# Altium footprint library DipComponent.PcbLib: 303 footprints (part 4 of 19)
Each footprint in its own frame and in the unit in brackets; x right, y up, seen from the top. Pads: shape width x height; smd on the part's side, far side on the other; paste and mask are expansions set on the pad; w line width, h text height; cw(c..) or ccw(c..) is an arc to the next point about the centre after c.
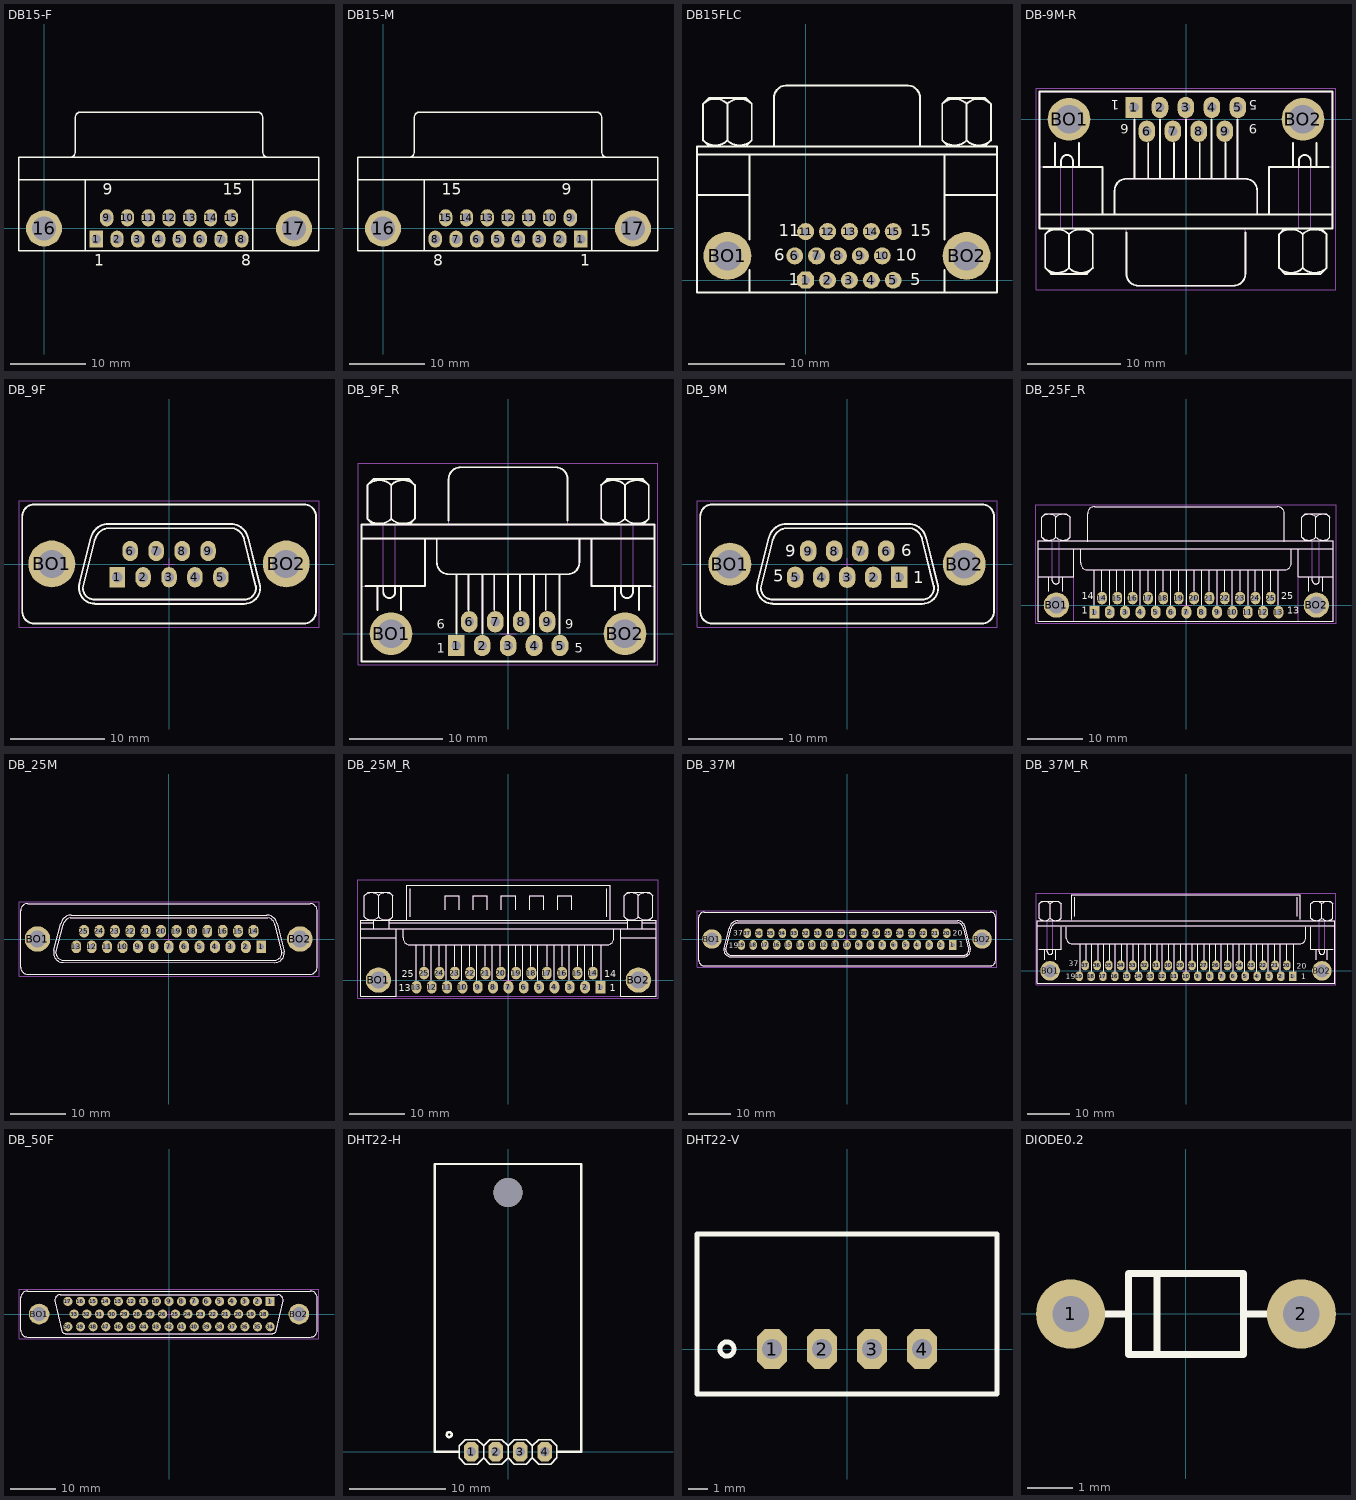
[diagram p3: the footprints below, top view; thin cyan lines are the x and y axes]

## DB15-F [mil]
pads (17):
  rect 70x90 hole 50: 1(273.98,-56.14)
  oval 70x90 hole 50: 2(383.03,-56.14) 3(492.09,-56.14) 4(601.14,-56.14) 5(710.2,-56.14) 6(819.25,-56.14) 7(928.31,-56.14) 8(1037.36,-56.14) 9(328.5,55.67) 10(437.56,55.67) 11(546.61,55.67) 12(655.67,55.67) 13(764.72,55.67) 14(873.78,55.67) 15(982.83,55.67)
  round 188.98 hole 125.2: 16(-0.24,-0.24) 17(1311.57,-0.24)
Top Overlay:
  lines w7.87: -131.73,255.67 1443.07,255.67 ; 136.18,373.98 ccw(c136.18,401.34) 163.54,401.34 163.54,582.44 ; 163.74,582.64 cw(c191.1,582.64) 191.1,610 1120.24,610 cw(c1120.24,582.64) 1147.6,582.64 ; 217.09,-118.35 217.09,255.67 ; 1094.25,-118.35 1094.25,255.67 ; 1147.79,582.44 1147.79,401.34 ccw(c1175.16,401.34) 1175.16,373.98 ; -131.73,-118.35 -131.73,373.78 1443.07,373.78 1443.07,-118.35 -131.73,-118.35
  text "1" at 264.13,-196.1 h59.06
  text "8" at 1035.67,-196.1 h59.06
  text "15" at 938.54,177.91 h59.06
  text "9" at 308.82,177.91 h59.06
3D body "CircuitWorks-DB15RA_M.STEP": height 494.69, standoff -137.2, extent -125.54,-125.16 1434.31,615

## DB15-M [mil]
pads (17):
  rect 70x90 hole 50: 1(1037.36,-56.14)
  oval 70x90 hole 50: 2(928.31,-56.14) 3(819.25,-56.14) 4(710.2,-56.14) 5(601.14,-56.14) 6(492.09,-56.14) 7(383.03,-56.14) 8(273.98,-56.14) 9(982.83,55.67) 10(873.78,55.67) 11(764.72,55.67) 12(655.67,55.67) 13(546.61,55.67) 14(437.56,55.67) 15(328.5,55.67)
  round 188.98 hole 125.2: 16(-0.24,-0.24) 17(1311.57,-0.24)
Top Overlay:
  lines w7.87: -131.73,255.67 1443.07,255.67 ; 136.18,373.98 ccw(c136.18,401.34) 163.54,401.34 163.54,582.44 ; 163.74,582.64 cw(c191.1,582.64) 191.1,610 1120.24,610 cw(c1120.24,582.64) 1147.6,582.64 ; 217.09,-118.35 217.09,255.67 ; 1094.25,-118.35 1094.25,255.67 ; 1147.79,582.44 1147.79,401.34 ccw(c1175.16,401.34) 1175.16,373.98 ; -131.73,-118.35 1443.07,-118.35 1443.07,373.78 -131.73,373.78 -131.73,-118.35
  text "15" at 308.82,177.91 h59.06
  text "9" at 938.54,177.91 h59.06
  text "1" at 1035.67,-196.1 h59.06
  text "8" at 264.13,-196.1 h59.06
3D body "CircuitWorks-DB15RA_M.STEP": height 494.69, standoff -137.2, extent -121.67,-125.35 1438.18,614.81

## DB15FLC [mil]
pads (17):
  oct 70x70 hole 35.43: 1(0,0)
  round 70 hole 35.43: 2(90,0) 3(180,0) 4(270,0) 5(360,0) 6(-45,100) 7(45,100) 8(135,100) 9(225,100) 10(315,100) 11(0,200) 12(90,200) 13(180,200) 14(270,200) 15(360,200)
  round 196.67 hole 118.33: BO1(-321.67,100) BO2(661.67,100)
Top Overlay:
  lines w8: -446.67,350 -230,350 ; -446.67,516.67 786.67,516.67 ; -421.75,574.91 ccw(c-371.67,625) -321.58,574.91 ; -421.75,725.09 cw(c-371.67,675) -321.58,725.09 ; -396.67,550 -421.67,575 -421.67,725 -396.67,750 -246.67,750 -221.67,725 -221.67,575 -246.67,550 ; -321.75,574.91 ccw(c-271.67,625) -221.58,574.91 ; -321.75,725.09 cw(c-271.67,675) -221.58,725.09 ; -321.67,575 -321.67,725 ; -230,-50 -230,41.67 ; -230,166.67 -230,350 ; -230,516.67 -230,350 ; -130,550 -130,750 cw(c-80,750) -80,800 420,800 cw(c420,750) 470,750 470,550 ; 561.58,574.91 ccw(c611.67,625) 661.75,574.91 ; 561.58,725.09 cw(c611.67,675) 661.75,725.09 ; 570,-50 570,41.67 ; 570,166.67 570,350 ; 570,516.67 570,350 ; 586.67,550 561.67,575 561.67,725 586.67,750 736.67,750 761.67,725 761.67,575 736.67,550 ; 661.58,574.91 ccw(c711.67,625) 761.75,574.91 ; 661.58,725.09 cw(c711.67,675) 761.75,725.09 ; 661.67,575 661.67,725 ; 786.67,350 570,350 ; -446.67,-50 786.67,-50 786.67,550 -446.67,550 -446.67,-50
  text "1" at -70,-20 h50
  text "6" at -130,80 h50
  text "11" at -110,180 h50
  text "15" at 430,180 h50
  text "10" at 370,80 h50
  text "5" at 430,-20 h50

## DB-9M-R [mil]
pads (11):
  rect 70x90 hole 40: 1(-218.75,50)
  oval 70x90 hole 40: 2(-109.58,50) 3(-0.42,50) 4(108.75,50) 5(217.92,50) 6(-164.58,-50) 7(-55.42,-50) 8(53.75,-50) 9(162.92,-50)
  round 180 hole 120: BO1(-492.08,0) BO2(492.08,0)
Top Overlay:
  lines w8: -617.08,-400 616.25,-400 ; -600.42,-200 -350.42,-200 -350.42,-400 ; -592.17,-625.09 ccw(c-542.08,-575) -492,-625.09 ; -592.17,-483.25 cw(c-542.08,-533.33) -492,-483.25 ; -567.08,-458.33 -592.08,-483.33 -592.08,-625 -567.08,-650 -417.08,-650 -392.08,-625 -392.08,-483.33 -417.08,-458.33 ; -550.42,-200 -550.42,-100 ; -525.42,-200 -525.42,-175 cw(c-500.42,-175) -475.42,-175 -475.42,-200 ; -492.17,-625.09 ccw(c-442.08,-575) -392,-625.09 ; -492.17,-483.25 cw(c-442.08,-533.33) -392,-483.25 ; -492.08,-625 -492.08,-483.33 ; -450.42,-200 -450.42,-100 ; -300.42,-400 -300.42,-300 cw(c-250.42,-300) -250.42,-250 249.58,-250 cw(c249.58,-300) 299.58,-300 299.58,-400 ; -250.42,-475 -250.42,-650 ccw(c-200.42,-650) -200.42,-700 199.58,-700 ccw(c199.58,-650) 249.58,-650 249.58,-475 ; -217.08,-250 -217.08,0 ; -158.75,-250 -158.75,-100 ; -108.75,-250 -108.75,0 ; -50.42,-250 -50.42,-100 ; -0.42,-250 -0.42,0 ; 57.92,-250 57.92,-100 ; 107.92,-250 107.92,0 ; 166.25,-250 166.25,-100 ; 216.25,-250 216.25,0 ; 349.58,-400 349.58,-200 599.58,-200 ; 391.16,-625.09 ccw(c441.25,-575) 491.34,-625.09 ; 391.16,-483.25 cw(c441.25,-533.33) 491.34,-483.25 ; 416.25,-458.33 391.25,-483.33 391.25,-625 416.25,-650 566.25,-650 591.25,-625 591.25,-483.33 566.25,-458.33 ; 449.58,-200 449.58,-100 ; 474.58,-200 474.58,-175 cw(c499.58,-175) 524.58,-175 524.58,-200 ; 491.16,-625.09 ccw(c541.25,-575) 591.34,-625.09 ; 491.16,-483.25 cw(c541.25,-533.33) 591.34,-483.25 ; 491.25,-625 491.25,-483.33 ; 549.58,-200 549.58,-100 ; -617.08,-458.33 616.25,-458.33 616.25,116.67 -617.08,116.67 -617.08,-458.33
  text "9" at 299.58,-20 h40
  text "5" at 299.58,80 h40
  text "1" at -280.42,80 h40
  text "6" at -240.42,-20 h40
Mechanical 13:
  lines w3.94: -617.08,-400 616.25,-400 ; -617.08,-200 -350.42,-200 -350.42,-400 ; -592.17,-625.09 ccw(c-542.08,-575) -492,-625.09 ; -592.17,-483.25 cw(c-542.08,-533.33) -492,-483.25 ; -567.08,-458.33 -592.08,-483.33 -592.08,-625 -567.08,-650 -417.08,-650 -392.08,-625 -392.08,-483.33 -417.08,-458.33 ; -550.42,-200 -550.42,-100 ; -526,-200 -526,-458.33 -476,-458.33 -476,-200 -475,-200 ; -525.42,-200 -525.42,-175 cw(c-500.42,-175) -475.42,-175 -475.42,-200 ; -492.17,-625.09 ccw(c-442.08,-575) -392,-625.09 ; -492.17,-483.25 cw(c-442.08,-533.33) -392,-483.25 ; -492.08,-625 -492.08,-483.33 ; -450.42,-200 -450.42,-100 ; -300.42,-400 -300.42,-300 cw(c-250.42,-300) -250.42,-250 249.58,-250 cw(c249.58,-300) 299.58,-300 299.58,-400 ; -250.42,-458.33 -250.42,-650 ccw(c-200.42,-650) -200.42,-700 199.58,-700 ccw(c199.58,-650) 249.58,-650 249.58,-458.33 ; -217.08,-250 -217.08,0 ; -158.75,-250 -158.75,-100 ; -108.75,-250 -108.75,0 ; -50.42,-250 -50.42,-100 ; -0.42,-250 -0.42,0 ; 57.92,-250 57.92,-100 ; 107.92,-250 107.92,0 ; 166.25,-250 166.25,-100 ; 216.25,-250 216.25,0 ; 349.58,-400 349.58,-200 616.25,-200 ; 391.16,-625.09 ccw(c441.25,-575) 491.34,-625.09 ; 391.16,-483.25 cw(c441.25,-533.33) 491.34,-483.25 ; 416.25,-458.33 391.25,-483.33 391.25,-625 416.25,-650 566.25,-650 591.25,-625 591.25,-483.33 566.25,-458.33 ; 449.58,-200 449.58,-100 ; 474.42,-458.33 474.42,-200 ; 474.58,-200 474.58,-175 cw(c499.58,-175) 524.58,-175 524.58,-200 ; 491.16,-625.09 ccw(c541.25,-575) 591.34,-625.09 ; 491.16,-483.25 cw(c541.25,-533.33) 591.34,-483.25 ; 491.25,-625 491.25,-483.33 ; 524.42,-458.33 524.42,-200 ; 549.58,-200 549.58,-100 ; -617.08,-458.33 -617.08,116.67 616.25,116.67 616.25,-458.33 -617.08,-458.33
Mechanical 15:
  lines w3.94: -35,0 0,0 ; 0,-35 0,0 ; 0,35 0,0 ; 35,0 0,0 ; -631,-716 -631,130 631,130 631,-716 -631,-716
3D body: height 236.22, standoff 0, extent -250.42,-700 249.58,-458.33
3D body: height 236.22, standoff 0, extent -300.65,-399.98 299.6,-249.55
3D body: height 39.37, standoff 0, extent -617.06,-399.98 -350.44,116.67
3D body: height 236.22, standoff 0, extent -617.06,-458.31 616.23,-400.02
3D body: height 39.37, standoff 0, extent 349.6,-399.98 616.23,116.67
3D body: height 157.48, standoff 78.74, extent 391.25,-650 591.34,-458.33
3D body: height 196.85, standoff 78.74, extent -592.08,-650 -392,-458.33
3D body: height 236.22, standoff 0, extent -350.44,-400 350,116.67
3D body: height 157.48, standoff 78.74, extent -526,-458.33 -475.42,-150
3D body: height 157.48, standoff 78.74, extent 474.42,-458.33 525,-150

## DB_9F [mil] "D Type Connector, 9 Pin,FeMale, ST"
height 433.07
pads (11):
  rect 65x85 hole 43.31: 1(-217.92,-55)
  oval 65x85 hole 43.31: 2(-108.92,-55) 3(0.08,-55) 4(109.08,-55) 5(218.08,-55) 6(-162.92,55) 7(-53.92,55) 8(55.08,55) 9(164.08,55)
  round 196.67 hole 118.33: BO1(-492.08,0.83) BO2(492.08,0.83)
Top Overlay:
  lines w8: -616.25,200.83 cw(c-566.25,200.83) -566.25,250.83 567.08,250.83 cw(c567.08,200.83) 617.08,200.83 617.08,-199.17 cw(c567.08,-199.17) 567.08,-249.17 -566.25,-249.17 cw(c-566.25,-199.17) -616.25,-199.17 -616.25,209.17 ; -377.08,-80.83 -328.75,109.17 ; -376.17,-80.79 ccw(c-312.08,-99.17) -312.08,-165.83 ; -328.45,109.75 cw(c-253.75,92.5) -253.75,169.16 257.58,169.16 cw(c257.58,92.5) 332.28,109.75 ; -312.08,100.83 -362.08,-99.17 ccw(c-312.08,-99.17) -312.08,-149.17 315.92,-149.17 ccw(c315.92,-99.17) 365.3,-91.35 ; -311.72,100.7 cw(c-245.42,84.17) -261.95,150.47 267.58,150.81 cw(c257.58,92.5) 316.17,100.73 ; -311.25,-166.67 315.92,-166.67 ccw(c315.92,-99.17) 382.91,-90.94 ; 315.92,100.83 365.92,-99.17 ; 332.58,109.17 382.58,-90.83
Mechanical 13:
  lines w3.94: -616.25,200.83 cw(c-566.25,200.83) -566.25,250.83 567.08,250.83 cw(c567.08,200.83) 617.08,200.83 617.08,-199.17 cw(c567.08,-199.17) 567.08,-249.17 -566.25,-249.17 cw(c-566.25,-199.17) -616.25,-199.17 -616.25,209.17 ; -377.14,-81.07 -328.75,109.17 ; -376.61,-79.09 ccw(c-311.25,-97.83) -311.25,-165.83 315.92,-166.67 ccw(c315.92,-99.17) 382.91,-90.94 332.28,109.75 ccw(c257.58,92.5) 257.58,169.16 -253.75,169.16 ccw(c-253.75,92.5) -328.45,109.75 ; -312.08,100.83 -362.08,-99.17 ccw(c-312.08,-99.17) -312.08,-149.17 317.05,-149.17 ccw(c317.05,-100.3) 365.92,-100.3 365.92,-99.17 316.15,100.87 ccw(c257.58,92.5) 267.58,150.81 -261.95,150.47 ccw(c-245.42,84.17) -311.72,100.7
Mechanical 15:
  lines w3.94: -25,0 0,0 ; 0,-25 0,0 ; 0,25 0,0 ; 25,0 0,0 ; -630,-265 -630,266 630,266 630,-265 -630,-265
3D body: height 433.07, standoff 0, extent -379.51,-166.67 382.91,169.16
3D body: height 208, standoff 200, extent -616.23,-249.15 617.06,250.81

## DB_9F_R [mil] "D Type Connector, 9 Pin,FeMale, RA"
height 492.13
pads (11):
  rect 70x90 hole 40: 1(-217.92,-50)
  oval 70x90 hole 40: 2(-108.75,-50) 3(0.42,-50) 4(109.58,-50) 5(218.75,-50) 6(-162.92,50) 7(-53.75,50) 8(55.42,50) 9(164.58,50)
  round 180 hole 120: BO1(-492.08,0) BO2(492.08,0)
Top Overlay:
  lines w8: -616.25,400 617.08,400 ; -599.58,200 -349.58,200 -349.58,400 ; -591.34,483.25 ccw(c-541.25,533.33) -491.16,483.25 ; -591.34,625.09 cw(c-541.25,575) -491.16,625.09 ; -566.25,458.33 -591.25,483.33 -591.25,625 -566.25,650 -416.25,650 -391.25,625 -391.25,483.33 -416.25,458.33 ; -549.58,100 -549.58,200 ; -524.58,200 -524.58,175 ccw(c-499.58,175) -474.58,175 -474.58,200 ; -491.34,483.25 ccw(c-441.25,533.33) -391.16,483.25 ; -491.34,625.09 cw(c-441.25,575) -391.16,625.09 ; -491.25,483.33 -491.25,625 ; -449.58,100 -449.58,200 ; -299.58,400 -299.58,300 ccw(c-249.58,300) -249.58,250 250.42,250 ccw(c250.42,300) 300.42,300 300.42,400 ; -249.58,475 -249.58,650 cw(c-199.58,650) -199.58,700 200.42,700 cw(c200.42,650) 250.42,650 250.42,475 ; -216.25,0 -216.25,250 ; -166.25,100 -166.25,250 ; -107.92,0 -107.92,250 ; -57.92,100 -57.92,250 ; 0.42,0 0.42,250 ; 50.42,100 50.42,250 ; 108.75,0 108.75,250 ; 158.75,100 158.75,250 ; 217.08,0 217.08,250 ; 350.42,400 350.42,200 600.42,200 ; 392,483.25 ccw(c442.08,533.33) 492.17,483.25 ; 392,625.09 cw(c442.08,575) 492.17,625.09 ; 417.08,458.33 392.08,483.33 392.08,625 417.08,650 567.08,650 592.08,625 592.08,483.33 567.08,458.33 ; 450.42,100 450.42,200 ; 475.42,200 475.42,175 ccw(c500.42,175) 525.42,175 525.42,200 ; 492,483.25 ccw(c542.08,533.33) 592.17,483.25 ; 492,625.09 cw(c542.08,575) 592.17,625.09 ; 492.08,483.33 492.08,625 ; 550.42,100 550.42,200 ; -616.25,-116.67 617.08,-116.67 617.08,458.33 -616.25,458.33 -616.25,-116.67
  text "9" at 240.42,20 h40
  text "5" at 280.42,-80 h40
  text "1" at -299.58,-80 h40
  text "6" at -299.58,20 h40
Mechanical 13:
  lines w3.94: -616.25,200 -349.58,200 -349.58,400 ; -616.25,400 617.08,400 ; -591.34,483.25 ccw(c-541.25,533.33) -491.16,483.25 ; -591.34,625.09 cw(c-541.25,575) -491.16,625.09 ; -566.25,458.33 -591.25,483.33 -591.25,625 -566.25,650 -416.25,650 -391.25,625 -391.25,483.33 -416.25,458.33 ; -549.58,100 -549.58,200 ; -524.58,200 -524.58,175 ccw(c-499.58,175) -474.58,175 -474.58,200 ; -524.42,200 -524.42,458.33 ; -491.34,483.25 ccw(c-441.25,533.33) -391.16,483.25 ; -491.34,625.09 cw(c-441.25,575) -391.16,625.09 ; -491.25,483.33 -491.25,625 ; -474.42,200 -474.42,458.33 ; -449.58,100 -449.58,200 ; -299.58,400 -299.58,300 ccw(c-249.58,300) -249.58,250 250.42,250 ccw(c250.42,300) 300.42,300 300.42,400 ; -249.58,458.33 -249.58,650 cw(c-199.58,650) -199.58,700 200.42,700 cw(c200.42,650) 250.42,650 250.42,458.33 ; -216.25,0 -216.25,250 ; -166.25,100 -166.25,250 ; -107.92,0 -107.92,250 ; -57.92,100 -57.92,250 ; 0.42,0 0.42,250 ; 50.42,100 50.42,250 ; 108.75,0 108.75,250 ; 158.75,100 158.75,250 ; 217.08,0 217.08,250 ; 350.42,400 350.42,200 617.08,200 ; 392,483.25 ccw(c442.08,533.33) 492.17,483.25 ; 392,625.09 cw(c442.08,575) 492.17,625.09 ; 417.08,458.33 392.08,483.33 392.08,625 417.08,650 567.08,650 592.08,625 592.08,483.33 567.08,458.33 ; 450.42,100 450.42,200 ; 475,200 476,200 476,458.33 526,458.33 526,200 ; 475.42,200 475.42,175 ccw(c500.42,175) 525.42,175 525.42,200 ; 492,483.25 ccw(c542.08,533.33) 592.17,483.25 ; 492,625.09 cw(c542.08,575) 592.17,625.09 ; 492.08,483.33 492.08,625 ; 550.42,100 550.42,200 ; -616.25,-116.67 -616.25,458.33 617.08,458.33 617.08,-116.67 -616.25,-116.67
Mechanical 15:
  lines w3.94: -35,0 0,0 ; 0,-35 0,0 ; 0,35 0,0 ; 35,0 0,0 ; -631,-130 631,-130 631,716 -631,716 -631,-130
3D body: height 157.48, standoff 78.74, extent -525,150 -474.42,458.33
3D body: height 157.48, standoff 78.74, extent 475.42,150 526,458.33
3D body: height 236.22, standoff 0, extent -350,-116.67 350.44,400
3D body: height 196.85, standoff 78.74, extent 392,458.33 592.08,650
3D body: height 157.48, standoff 78.74, extent -591.34,458.33 -391.25,650
3D body: height 39.37, standoff 0, extent -616.23,-116.67 -349.6,399.98
3D body: height 236.22, standoff 0, extent -616.23,400.02 617.06,458.31
3D body: height 39.37, standoff 0, extent 350.44,-116.67 617.06,399.98
3D body: height 236.22, standoff 0, extent -299.6,249.55 300.65,399.98
3D body: height 236.22, standoff 0, extent -249.58,458.33 250.42,700

## DB_9M [mil] "D Type Connector, 9 Pin,Male, ST"
height 433.07
pads (11):
  rect 70x90 hole 40: 1(218.33,-55)
  oval 70x90 hole 40: 2(109.17,-55) 3(0,-55) 4(-109.17,-55) 5(-218.33,-55) 6(163.75,55) 7(54.58,55) 8(-54.58,55) 9(-163.75,55)
  round 180 hole 120: BO1(-492.08,0) BO2(492.08,0)
Top Overlay:
  lines w8: -616.67,200.83 cw(c-566.67,200.83) -566.67,250.83 566.66,250.83 cw(c566.66,200.83) 616.66,200.83 616.66,-199.17 cw(c566.66,-199.17) 566.66,-249.17 -566.67,-249.17 cw(c-566.67,-199.17) -616.67,-199.17 -616.67,209.17 ; -377.5,-80.83 -329.17,109.17 ; -376.58,-80.79 ccw(c-312.5,-99.17) -312.5,-165.83 ; -328.87,109.75 cw(c-254.17,92.5) -254.17,169.16 257.17,169.16 cw(c257.17,92.5) 331.87,109.75 ; -312.5,100.83 -362.5,-99.17 ccw(c-312.5,-99.17) -312.5,-149.17 315.5,-149.17 ccw(c315.5,-99.17) 364.88,-91.35 ; -312.14,100.7 cw(c-245.83,84.17) -262.37,150.47 267.16,150.81 cw(c257.17,92.5) 315.76,100.73 ; -311.67,-166.67 315.5,-166.67 ccw(c315.5,-99.17) 382.5,-90.94 ; 315.5,100.83 365.5,-99.17 ; 332.17,109.17 382.17,-90.83
  text "1" at 277.33,-80 h50
  text "5" at -309.67,-75 h50
  text "9" at -259.67,30 h50
  text "6" at 227.33,34 h50
Mechanical 13:
  lines w3.94: -616.67,200.83 cw(c-566.67,200.83) -566.67,250.83 566.66,250.83 cw(c566.66,200.83) 616.66,200.83 616.66,-199.17 cw(c566.66,-199.17) 566.66,-249.17 -566.67,-249.17 cw(c-566.67,-199.17) -616.67,-199.17 -616.67,209.17 ; -377.56,-81.07 -329.17,109.17 ; -377.03,-79.09 ccw(c-311.67,-97.83) -311.67,-165.83 315.5,-166.67 ccw(c315.5,-99.17) 382.5,-90.94 331.87,109.75 ccw(c257.17,92.5) 257.17,169.16 -254.17,169.16 ccw(c-254.17,92.5) -328.87,109.75 ; -312.5,100.83 -362.5,-99.17 ccw(c-312.5,-99.17) -312.5,-149.17 316.63,-149.17 ccw(c316.63,-100.3) 365.5,-100.3 365.5,-99.17 315.74,100.87 ccw(c257.17,92.5) 267.16,150.81 -262.37,150.47 ccw(c-245.83,84.17) -312.14,100.7
Mechanical 15:
  lines w3.94: -25.42,0 -0.42,0 ; -0.42,-25 -0.42,0 ; -0.42,25 -0.42,0 ; 24.58,0 -0.42,0 ; -630.42,-265 -630.42,266 629.58,266 629.58,-265 -630.42,-265
3D body: height 208, standoff 200, extent -616.65,-249.15 616.64,250.81
3D body: height 433.07, standoff 0, extent -379.93,-166.67 382.5,169.16

## DB_25F_R [mil] "D Type Connector, 25 Pin,FeMale, RA"
height 492.13
pads (27):
  rect 70x90 hole 40: 1(-654.67,-50)
  oval 70x90 hole 40: 2(-545.5,-50) 3(-436.33,-50) 4(-327.17,-50) 5(-218,-50) 6(-108.83,-50) 7(0.34,-50) 8(109.5,-50) 9(218.67,-50) 10(327.84,-50) 11(437,-50) 12(546.17,-50) 13(655.34,-50) 14(-600.5,50) 15(-491.33,50) 16(-382.17,50) 17(-273,50) 18(-163.83,50) 19(-54.66,50) 20(54.5,50) 21(163.67,50) 22(272.84,50) 23(382,50) 24(491.17,50) 25(600.34,50)
  round 180 hole 120: BO1(-925,0) BO2(925,0)
Top Overlay:
  lines w8: -1053,200 -803,200 -803,400 ; -1053,400 1047,400 ; -1028.09,483.25 ccw(c-978,533.33) -927.91,483.25 ; -1028.09,625.09 cw(c-978,575) -927.91,625.09 ; -1003,458.33 -1028,483.33 -1028,625 -1003,650 -853,650 -828,625 -828,483.33 -853,458.33 ; -978,100 -978,200 ; -953,200 -953,175 ccw(c-928,175) -903,175 -903,200 ; -928.09,483.25 ccw(c-878,533.33) -827.91,483.25 ; -928.09,625.09 cw(c-878,575) -827.91,625.09 ; -928,483.33 -928,625 ; -878,100 -878,200 ; -753,400 -753,300 ccw(c-703,300) -703,250 697,250 ccw(c697,300) 747,300 747,400 ; -703,450 -703,650 cw(c-653,650) -653,700 647,700 cw(c647,650) 697,650 697,450 ; -655.5,0 -655.5,248.33 ; -600.5,100 -600.5,250 ; -546.33,0 -546.33,248.33 ; -495.5,100 -494.67,250 ; -437.17,0 -437.17,248.33 ; -380.5,100 -380.5,250 ; -328,0 -328,248.33 ; -270.5,100 -270.5,248.33 ; -218.83,0 -218.83,248.33 ; -165.5,100 -165.5,248.33 ; -109.67,0 -109.67,248.33 ; -55.5,100 -55.5,248.33 ; -0.67,250 -0.5,0 ; 54.5,100 54.5,248.33 ; 109.5,0 109.5,248.33 ; 164.5,100 164.5,248.33 ; 219.5,0 219.5,248.33 ; 274.5,100 274.5,248.33 ; 327,0 327,248.33 ; 384.5,100 384.5,248.33 ; 439.5,0 439.5,248.33 ; 489.5,100 489.5,248.33 ; 544.5,0 544.5,248.33 ; 599.5,100 599.5,248.33 ; 654.5,0 654.5,248.33 ; 797,400 797,200 1047,200 ; 821.91,483.25 ccw(c872,533.33) 922.09,483.25 ; 821.91,625.09 cw(c872,575) 922.09,625.09 ; 847,458.33 822,483.33 822,625 847,650 997,650 1022,625 1022,483.33 997,458.33 ; 872,100 872,200 ; 897,200 897,175 ccw(c922,175) 947,175 947,200 ; 921.91,483.25 ccw(c972,533.33) 1022.09,483.25 ; 921.91,625.09 cw(c972,575) 1022.09,625.09 ; 922,483.33 922,625 ; 972,100 972,200 ; -1053,-116.67 -1053,458.33 1047,458.33 1047,-116.67 -1053,-116.67
  text "13" at 717,-60 h50
  text "25" at 677,40 h50
  text "14" at -743,40 h50
  text "1" at -743,-60 h50
Mechanical 13:
  lines w3.94: -1053,200 -803,200 ; -1053,400 1047,400 ; -1028.09,483.25 ccw(c-978,533.33) -927.91,483.25 ; -1028.09,625.09 cw(c-978,575) -927.91,625.09 ; -1003,458.33 -1028,483.33 -1028,625 -1003,650 -853,650 -828,625 -828,483.33 -853,458.33 ; -978,100 -978,200 ; -953,200 -953,175 ccw(c-928,175) -903,175 -903,200 ; -952.77,200.02 -952.77,458.35 ; -928.09,483.25 ccw(c-878,533.33) -827.91,483.25 ; -928.09,625.09 cw(c-878,575) -827.91,625.09 ; -928,483.33 -928,625 ; -902.77,200.02 -902.77,458.35 ; -878,100 -878,200 ; -803,400 -803,200 ; -802.67,-116.67 -802.67,200 -803,200 ; -753,400 -753,300 ccw(c-703,300) -703,250 697,250 ccw(c697,300) 747,300 747,400 ; -703,458.33 -703,650 cw(c-653,650) -653,700 647,700 cw(c647,650) 697,650 697,458.33 ; -655.5,0 -655.5,248.33 ; -600.5,100 -600.5,250 ; -546.33,0 -546.33,248.33 ; -495.5,100 -494.67,250 ; -437.17,0 -437.17,248.33 ; -380.5,100 -380.5,250 ; -328,0 -328,248.33 ; -270.5,100 -270.5,248.33 ; -218.83,0 -218.83,248.33 ; -165.5,100 -165.5,248.33 ; -109.67,0 -109.67,248.33 ; -55.5,100 -55.5,248.33 ; -0.67,250 -0.5,0 ; 54.5,100 54.5,248.33 ; 109.5,0 109.5,248.33 ; 164.5,100 164.5,248.33 ; 219.5,0 219.5,248.33 ; 274.5,100 274.5,248.33 ; 327,0 327,248.33 ; 384.5,100 384.5,248.33 ; 439.5,0 439.5,248.33 ; 489.5,100 489.5,248.33 ; 544.5,0 544.5,248.33 ; 599.5,100 599.5,248.33 ; 654.5,0 654.5,248.33 ; 797,400 797,200 ; 797.33,-116.67 797.33,200 797,200 ; 821.91,483.25 ccw(c872,533.33) 922.09,483.25 ; 821.91,625.09 cw(c872,575) 922.09,625.09 ; 847,458.33 822,483.33 822,625 847,650 997,650 1022,625 1022,483.33 997,458.33 ; 872,100 872,200 ; 897,200 897,175 ccw(c922,175) 947,175 947,200 ; 897.23,200.02 897.23,458.35 ; 921.91,483.25 ccw(c972,533.33) 1022.09,483.25 ; 921.91,625.09 cw(c972,575) 1022.09,625.09 ; 922,483.33 922,625 ; 947.23,200.02 947.23,458.35 ; 972,100 972,200 ; 1047,200 797,200 ; -1053,-116.67 1047,-116.67 1047,458.33 -1053,458.33 -1053,-116.67
Mechanical 15:
  lines w3.94: -40,0 0,0 ; 0,-40 0,0 ; 0,40 0,0 ; 40,0 0,0 ; -1070,-130 -1070,715 1065,715 1065,-130 -1070,-130
3D body: height 314.96, standoff 157.48, extent 821.91,458.33 1022.09,650
3D body: height 314.96, standoff 157.48, extent -1028.09,458.33 -827.91,650
3D body: height 354.33, standoff 118.11, extent -703,458.33 697,700
3D body: height 492.13, standoff 0, extent -753.43,250.43 747.08,400
3D body: height 492.13, standoff 0, extent -803.02,-116.67 797.35,400
3D body: height 78.74, standoff 0, extent -1052.98,-116.65 -802.69,199.98
3D body: height 78.74, standoff 0, extent -1052.98,200.02 -803.02,399.98
3D body: height 492.13, standoff 0, extent -1052.98,400.02 1046.98,458.31
3D body: height 78.74, standoff 0, extent 797.35,-116.65 1046.98,199.98
3D body: height 78.74, standoff 0, extent 797.02,200.02 1046.98,399.98
3D body: height 275.59, standoff 196.85, extent -953.35,150.02 -902.77,458.35
3D body: height 275.59, standoff 196.85, extent 896.65,150.02 947.23,458.35

## DB_25M [mil] "D Type Connector, 25 Pin,Male, ST"
height 433.07
pads (27):
  rect 70x90 hole 40: 1(655.83,-55)
  oval 70x90 hole 40: 2(546.66,-55) 3(437.5,-55) 4(328.33,-55) 5(219.16,-55) 6(110,-55) 7(0.83,-55) 8(-108.34,-55) 9(-217.5,-55) 10(-326.67,-55) 11(-435.84,-55) 12(-545.01,-55) 13(-654.17,-55) 14(601.25,55) 15(492.08,55) 16(382.91,55) 17(273.75,55) 18(164.58,55) 19(55.41,55) 20(-53.76,55) 21(-162.92,55) 22(-272.09,55) 23(-381.25,55) 24(-490.42,55) 25(-599.59,55)
  round 180 hole 120: BO1(-929,0) BO2(929,0)
Top Overlay:
  lines w8: -813.17,-81.07 -764.83,108.93 ; -812.25,-81.03 ccw(c-748.17,-99.4) -748.17,-166.07 751.83,-167.74 ; -764.53,109.51 cw(c-689.83,92.26) -689.83,168.93 693.5,168.93 cw(c693.5,92.26) 768.2,109.51 ; -748.17,100.6 -798.17,-99.4 ccw(c-748.17,-99.4) -748.17,-149.4 751.83,-149.4 ccw(c751.83,-99.4) 801.22,-91.58 ; -747.8,100.46 cw(c-681.5,83.93) -698.03,150.23 ; -698.17,150.6 701.83,150.6 ; 709.81,149.14 cw(c693.5,92.26) 752.09,100.5 ; 751.83,-166.9 ccw(c751.83,-99.4) 818.83,-91.18 ; 751.83,100.6 801.83,-99.4 ; 768.5,108.93 818.5,-91.07 ; -1048.17,-199.4 ccw(c-998.17,-199.4) -998.17,-249.4 1001.83,-249.4 ccw(c1001.83,-199.4) 1051.83,-199.4 1051.83,200.6 ccw(c1001.83,200.6) 1001.83,250.6 -998.17,250.6 ccw(c-998.17,200.6) -1048.17,200.6 -1048.17,-199.4
Mechanical 13:
  lines w3.94: -813.17,-81.07 -764.83,108.93 ; -812.25,-81.03 ccw(c-748.17,-99.4) -748.17,-166.07 751.83,-167.74 ; -764.53,109.51 cw(c-689.83,92.26) -689.83,168.93 693.5,168.93 cw(c693.5,92.26) 768.2,109.51 ; -748.17,100.6 -798.17,-99.4 ccw(c-748.17,-99.4) -748.17,-149.4 751.83,-149.4 ccw(c751.83,-99.4) 801.22,-91.58 ; -747.8,100.46 cw(c-681.5,83.93) -698.03,150.23 ; -698.17,150.6 701.83,150.6 ; 709.81,149.14 cw(c693.5,92.26) 752.09,100.5 ; 751.83,-166.9 ccw(c751.83,-99.4) 818.83,-91.18 ; 751.83,100.6 801.83,-99.4 ; 768.5,108.93 818.5,-91.07 ; -1048.17,-199.4 ccw(c-998.17,-199.4) -998.17,-249.4 1001.83,-249.4 ccw(c1001.83,-199.4) 1051.83,-199.4 1051.83,200.6 ccw(c1001.83,200.6) 1001.83,250.6 -998.17,250.6 ccw(c-998.17,200.6) -1048.17,200.6 -1048.17,-199.4
Mechanical 15:
  lines w3.94: -35,0 0,0 ; 0,-35 0,0 ; 0,35 0,0 ; 35,0 0,0 ; -1060,-265 1065,-265 1065,265 -1060,265 -1060,-265
3D body: height 208, standoff 200, extent -1048.15,-249.38 1051.81,250.58
3D body: height 433.07, standoff 0, extent -812.25,-166.9 818.83,168.93

## DB_25M_R [mil] "D Type Connector, 25 Pin,Male, RA"
height 492.13
pads (27):
  rect 70x90 hole 40: 1(655.17,-50)
  oval 70x90 hole 40: 2(546,-50) 3(436.83,-50) 4(327.67,-50) 5(218.5,-50) 6(109.33,-50) 7(0.16,-50) 8(-109,-50) 9(-218.17,-50) 10(-327.34,-50) 11(-436.5,-50) 12(-545.67,-50) 13(-654.84,-50) 14(601,50) 15(491.84,50) 16(382.67,50) 17(273.5,50) 18(164.34,50) 19(55.17,50) 20(-54,50) 21(-163.16,50) 22(-272.33,50) 23(-381.5,50) 24(-490.67,50) 25(-599.83,50)
  round 180 hole 120: BO1(-925,0) BO2(925,0)
Top Overlay:
  lines w8: -1049,300 -799,300 ; -1049,366.67 1051,366.67 ; -1049,408.33 -957.33,408.33 ; -1024.09,449.91 ccw(c-974,500) -923.91,449.91 ; -1024.09,600.09 cw(c-974,550) -923.91,600.09 ; -999,425 -1024,450 -1024,600 -999,625 -849,625 -824,600 -824,450 -849,425 -849,366.67 ; -957.33,366.67 -957.33,425 ; -924.09,449.91 ccw(c-874,500) -823.91,449.91 ; -924.09,600.09 cw(c-874,550) -823.91,600.09 ; -924,450 -924,600 ; -849,408.33 851,408.33 ; -799,366.67 -799,-116.67 -1049,-116.67 -1049,425 1051,425 1051,-116.67 801,-116.67 801,366.67 ; -749,366.67 -749,300 ccw(c-699,300) -699,250 701,250 ccw(c701,300) 751,300 751,366.67 ; -724,425 -724,675 726,675 726,425 ; -699,450 -699,650 ; -657.33,0 -657.33,250 ; -599,100 -599,250 ; -549,0 -549,250 ; -490.67,100 -490.67,250 ; -449,500 -449,600 -349,600 -349,500 ; -440.67,0 -440.67,250 ; -382.33,100 -382.33,250 ; -332.33,0 -332.33,250 ; -274,100 -274,250 ; -249,500 -249,600 -149,600 -149,500 ; -224,0 -224,250 ; -165.67,100 -165.67,250 ; -115.67,0 -115.67,250 ; -57.33,100 -57.33,250 ; -49,500 -49,600 51,600 51,500 ; 1,0 1,250 ; 51,100 51,250 ; 101,0 101,250 ; 151,500 151,600 251,600 251,500 ; 159.33,100 159.33,250 ; 209.33,0 209.33,250 ; 276,100 276,250 ; 326,0 326,250 ; 351,500 351,600 451,600 451,500 ; 384.33,100 384.33,250 ; 434.33,0 434.33,250 ; 492.67,100 492.67,250 ; 542.67,0 542.67,250 ; 601,100 601,250 ; 659.33,0 659.33,250 ; 701,450 701,650 ; 801,300 1051,300 ; 825.91,449.91 ccw(c876,500) 926.09,449.91 ; 825.91,600.09 cw(c876,550) 926.09,600.09 ; 851,366.67 851,425 826,450 826,600 851,625 1001,625 1026,600 1026,450 1001,425 ; 925.91,449.91 ccw(c976,500) 1026.09,449.91 ; 925.91,600.09 cw(c976,550) 1026.09,600.09 ; 926,450 926,600 ; 951,366.67 951,425 ; 951,408.33 1051,408.33
  text "25" at -759,20 h50
  text "13" at -779,-80 h50
  text "1" at 721,-80 h50
  text "14" at 681,20 h50
Mechanical 13:
  lines w3.94: -1049,300 -799,300 ; -1049,366.67 1051,366.67 ; -1049,408.33 -957.33,408.33 ; -1024.09,449.91 ccw(c-974,500) -923.91,449.91 ; -1024.09,600.09 cw(c-974,550) -923.91,600.09 ; -999,425 -1024,450 -1024,600 -999,625 -849,625 -824,600 -824,450 -849,425 -849,366.67 ; -957.33,366.67 -957.33,425 ; -924.09,449.91 ccw(c-874,500) -823.91,449.91 ; -924.09,600.09 cw(c-874,550) -823.91,600.09 ; -924,450 -924,600 ; -849,408.33 851,408.33 ; -799,366.67 -799,-116.67 ; -749,366.67 -749,300 ccw(c-699,300) -699,250 701,250 ccw(c701,300) 751,300 751,366.67 ; -724,425 -724,675 726,675 726,425 ; -699,450 -699,650 ; -657.33,0 -657.33,250 ; -599,100 -599,250 ; -549,0 -549,250 ; -490.67,100 -490.67,250 ; -449,500 -449,600 -349,600 -349,500 ; -440.67,0 -440.67,250 ; -382.33,100 -382.33,250 ; -332.33,0 -332.33,250 ; -274,100 -274,250 ; -249,500 -249,600 -149,600 -149,500 ; -224,0 -224,250 ; -165.67,100 -165.67,250 ; -115.67,0 -115.67,250 ; -57.33,100 -57.33,250 ; -49,500 -49,600 51,600 51,500 ; 1,0 1,250 ; 51,100 51,250 ; 101,0 101,250 ; 151,500 151,600 251,600 251,500 ; 159.33,100 159.33,250 ; 209.33,0 209.33,250 ; 276,100 276,250 ; 326,0 326,250 ; 351,500 351,600 451,600 451,500 ; 384.33,100 384.33,250 ; 434.33,0 434.33,250 ; 492.67,100 492.67,250 ; 542.67,0 542.67,250 ; 601,100 601,250 ; 659.33,0 659.33,250 ; 701,450 701,650 ; 801,300 1051,300 ; 801,366.67 801,-116.67 ; 825.91,449.91 ccw(c876,500) 926.09,449.91 ; 825.91,600.09 cw(c876,550) 926.09,600.09 ; 851,366.67 851,425 826,450 826,600 851,625 1001,625 1026,600 1026,450 1001,425 ; 925.91,449.91 ccw(c976,500) 1026.09,449.91 ; 925.91,600.09 cw(c976,550) 1026.09,600.09 ; 926,450 926,600 ; 951,366.67 951,425 ; 951,408.33 1051,408.33 ; -799,-116.67 -1049,-116.67 -1049,425 1051,425 1051,-116.67 801,-116.67 ; -799,-116.67 801,-116.67
Mechanical 15:
  lines w3.94: -40.17,0 -0.17,0 ; -0.17,-40 -0.17,0 ; -0.17,40 -0.17,0 ; 39.83,0 -0.17,0 ; -1070.17,-130 1064.83,-130 1064.83,715 -1070.17,715 -1070.17,-130
3D body: height 314.96, standoff 157.48, extent -1024,425 -823.91,625
3D body: height 314.96, standoff 157.48, extent 825.91,425 1026,625
3D body: height 492.13, standoff 0, extent -749,249.57 751.07,366.67
3D body: height 78.74, standoff 0, extent -800.83,-116.67 801,366.67
3D body: height 492.13, standoff 0, extent 951.02,408.35 1050.98,424.98
3D body: height 492.13, standoff 0, extent 951.02,366.69 1050.98,408.31
3D body: height 492.13, standoff 0, extent 851.02,366.69 950.98,424.98
3D body: height 492.13, standoff 0, extent 801.02,300.02 1050.98,366.65
3D body: height 78.74, standoff 0, extent 801.02,-116.65 1050.98,299.98
3D body: height 354.33, standoff 78.74, extent -723.98,425.02 725.98,674.98
3D body: height 492.13, standoff 0, extent -848.98,408.35 850.98,424.98
3D body: height 492.13, standoff 0, extent -848.98,366.69 850.98,408.31
3D body: height 492.13, standoff 0, extent -957.31,366.69 -849.02,424.98
3D body: height 492.13, standoff 0, extent -1048.98,408.35 -957.35,424.98
3D body: height 492.13, standoff 0, extent -1048.98,366.69 -957.35,408.31
3D body: height 492.13, standoff 0, extent -1048.98,300.02 -799.02,366.65
3D body: height 78.74, standoff 0, extent -1048.98,-116.65 -799.02,299.98

## DB_37M [mil] "D Type Connector, 37 Pin,Male, ST"
height 433.07
pads (39):
  rect 70x90 hole 40: 1(982.5,-55)
  oval 70x90 hole 40: 2(873.34,-55) 3(764.17,-55) 4(655,-55) 5(545.84,-55) 6(436.67,-55) 7(327.5,-55) 8(218.33,-55) 9(109.17,-55) 10(0,-55) 11(-109.17,-55) 12(-218.33,-55) 13(-327.5,-55) 14(-436.67,-55) 15(-545.84,-55) 16(-655,-55) 17(-764.17,-55) 18(-873.34,-55) 19(-982.5,-55) 20(927.92,55) 21(818.75,55) 22(709.59,55) 23(600.42,55) 24(491.25,55) 25(382.08,55) 26(272.92,55) 27(163.75,55) 28(54.58,55) 29(-54.58,55) 30(-163.75,55) 31(-272.92,55) 32(-382.08,55) 33(-491.25,55) 34(-600.42,55) 35(-709.59,55) 36(-818.75,55) 37(-927.92,55)
  round 180 hole 120: BO1(-1256.25,0) BO2(1256.25,0)
Top Overlay:
  lines w8: -1083.75,-149 1081.25,-149 ccw(c1085.85,-103.5) 1131.25,-98 1081.25,102 ccw(c1022.97,93.38) 1035.25,151 ; -1082.75,-149 cw(c-1078.04,-98.51) -1128.75,-98 -1078.75,102 cw(c-1003.46,75.19) -1028.75,151 1036.25,151 ; 1331.25,-249 ccw(c1331.25,-199) 1381.25,-199 1381.25,201 ccw(c1331.25,201) 1331.25,251 ; 1336.25,-249 -1328.75,-249 cw(c-1328.75,-199) -1378.75,-199 -1378.75,201 cw(c-1328.75,201) -1328.75,251 1336.25,251 ; -1143.75,-84 ccw(c-1077.33,-98.12) -1078.75,-166 1081.25,-166 ccw(c1082.85,-100) 1148.25,-91 1092.25,128 ccw(c1029.43,100.41) 1031.25,169 -1013.75,169 ccw(c-1014.26,86.39) -1095.75,100 -1143.75,-84
  text "19" at -1101.75,-84 h50
  text "37" at -1057.75,33 h50
  text "1" at 1038.75,-72 h50
  text "20" at 981.25,30 h50
Mechanical 13:
  lines w3.94: -1083.75,-149 1081.25,-149 ccw(c1085.85,-103.5) 1131.25,-98 1081.25,102 ccw(c1022.97,93.38) 1035.25,151 ; -1082.75,-149 cw(c-1078.04,-98.51) -1128.75,-98 -1078.75,102 cw(c-1003.46,75.19) -1028.75,151 1036.25,151 ; 1331.25,-249 ccw(c1331.25,-199) 1381.25,-199 1381.25,201 ccw(c1331.25,201) 1331.25,251 ; 1336.25,-249 -1328.75,-249 cw(c-1328.75,-199) -1378.75,-199 -1378.75,201 cw(c-1328.75,201) -1328.75,251 1336.25,251 ; -1143.75,-84 ccw(c-1077.33,-98.12) -1078.75,-166 1081.25,-166 ccw(c1082.85,-100) 1148.25,-91 1092.25,128 ccw(c1029.43,100.41) 1031.25,169 -1013.75,169 ccw(c-1014.26,86.39) -1095.75,100 -1143.75,-84
Mechanical 15:
  lines w3.94: -30,0 0,0 ; 0,-30 0,0 ; 0,30 0,0 ; 30,0 0,0 ; -1395,-264 1395,-264 1395,265 -1395,265 -1395,-264
3D body: height 433.07, standoff 0, extent -1143.75,-166 1148.25,169
3D body: height 208, standoff 200, extent -1378.75,-249 1381.25,251

## DB_37M_R [mil] "D Type Connector, 37 Pin,Male, RA"
height 492.13
pads (39):
  rect 70x90 hole 40: 1(982.5,-50)
  oval 70x90 hole 40: 2(873.34,-50) 3(764.17,-50) 4(655,-50) 5(545.84,-50) 6(436.67,-50) 7(327.5,-50) 8(218.33,-50) 9(109.17,-50) 10(0,-50) 11(-109.17,-50) 12(-218.33,-50) 13(-327.5,-50) 14(-436.67,-50) 15(-545.84,-50) 16(-655,-50) 17(-764.17,-50) 18(-873.34,-50) 19(-982.5,-50) 20(928.34,50) 21(819.17,50) 22(710.01,50) 23(600.84,50) 24(491.67,50) 25(382.51,50) 26(273.34,50) 27(164.17,50) 28(55.01,50) 29(-54.16,50) 30(-163.33,50) 31(-272.5,50) 32(-381.66,50) 33(-490.83,50) 34(-600,50) 35(-709.16,50) 36(-818.33,50) 37(-927.5,50)
  round 180 hole 120: BO1(-1250,0) BO2(1250,0)
Top Overlay:
  lines w8: -1366.67,416.67 1366.67,416.67 ; -1350.09,483.25 ccw(c-1300,533.33) -1249.91,483.25 ; -1350.09,616.75 cw(c-1300,566.67) -1249.91,616.75 ; -1350,200 -1150,200 -1150,400 ; -1325,458.33 -1350,483.33 -1350,491.67 -1350,616.67 -1325,641.67 -1175,641.67 -1150,616.67 -1150,608.33 -1150,483.33 -1175,458.33 ; -1300,100 -1300,200 ; -1275,200 -1275,175 ccw(c-1250,175) -1225,175 -1225,200 ; -1250.09,483.25 ccw(c-1200,533.33) -1149.91,483.25 ; -1250.09,616.75 cw(c-1200,566.67) -1149.91,616.75 ; -1250,483.33 -1250,616.67 ; -1200,100 -1200,200 ; -1100,400 -1100,300 ccw(c-1050,300) -1050,250 1050,250 ccw(c1050,300) 1100,300 1100,400 ; -1050,475 -1050,700 1050,700 1050,475 ; -1025,500 -1025,675 ; -975,-8.33 -975,250 ; -916.67,91.67 -916.67,250 ; -866.67,-8.33 -866.67,250 ; -808.33,91.67 -808.33,250 ; -758.33,-8.33 -758.33,250 ; -700,91.67 -700,250 ; -650,-8.33 -650,250 ; -591.67,91.67 -591.67,250 ; -541.67,-8.33 -541.67,250 ; -483.33,91.67 -483.33,250 ; -433.33,-8.33 -433.33,250 ; -375,91.67 -375,250 ; -325,-8.33 -325,250 ; -266.67,91.67 -266.67,250 ; -216.67,-8.33 -216.67,250 ; -158.33,91.67 -158.33,250 ; -108.33,-8.33 -108.33,250 ; -50,91.67 -50,250 ; 0,-8.33 0,250 ; 58.33,91.67 58.33,250 ; 108.33,-8.33 108.33,250 ; 166.67,91.67 166.67,250 ; 216.67,-8.33 216.67,250 ; 275,91.67 275,250 ; 325,-8.33 325,250 ; 383.33,91.67 383.33,250 ; 433.33,-8.33 433.33,250 ; 491.67,91.67 491.67,250 ; 541.67,-8.33 541.67,250 ; 600,91.67 600,250 ; 650,-8.33 650,250 ; 708.33,91.67 708.33,250 ; 758.33,-8.33 758.33,250 ; 816.67,91.67 816.67,250 ; 866.67,-8.33 866.67,250 ; 925,91.67 925,250 ; 991.67,-8.33 991.67,250 ; 1025,500 1025,675 ; 1149.91,483.25 ccw(c1200,533.33) 1250.09,483.25 ; 1149.91,616.75 cw(c1200,566.67) 1250.09,616.75 ; 1150,400 1150,200 1350,200 ; 1175,458.33 1150,483.33 1150,491.67 1150,616.67 1175,641.67 1325,641.67 1350,616.67 1350,483.33 1325,458.33 ; 1200,100 1200,200 ; 1225,200 1225,175 ccw(c1250,175) 1275,175 1275,200 ; 1249.91,483.25 ccw(c1300,533.33) 1350.09,483.25 ; 1249.91,616.75 cw(c1300,566.67) 1350.09,616.75 ; 1250,483.33 1250,616.67 ; 1300,100 1300,200 ; -1366.67,-116.67 1366.67,-116.67 1366.67,458.33 -1366.67,458.33 -1366.67,-116.67
  text "20" at 1020,20 h50
  text "1" at 1060,-80 h50
  text "37" at -1080,40 h50
  text "19" at -1104.67,-78 h50
Mechanical 13:
  lines w3.94: -1366.67,200 -1150,200 -1150,416.67 ; -1366.67,416.67 1366.67,416.67 ; -1350.09,483.25 ccw(c-1300,533.33) -1249.91,483.25 ; -1350.09,616.75 cw(c-1300,566.67) -1249.91,616.75 ; -1325,458.33 -1350,483.33 -1350,491.67 -1350,616.67 -1325,641.67 -1175,641.67 -1150,616.67 -1150,608.33 -1150,483.33 -1175,458.33 ; -1300,100 -1300,200 ; -1275,458.33 -1275,200 -1275,175 ccw(c-1250,175) -1225,175 -1225,200 -1225,458.33 ; -1250.09,483.25 ccw(c-1200,533.33) -1149.91,483.25 ; -1250.09,616.75 cw(c-1200,566.67) -1149.91,616.75 ; -1250,483.33 -1250,616.67 ; -1200,100 -1200,200 ; -1100,416.67 -1100,300 ccw(c-1050,300) -1050,250 1050,250 ccw(c1050,300) 1100,300 1100,416.67 ; -1050,458.33 -1050,700 1050,700 1050,458.33 ; -1025,500 -1025,675 ; -975,-8.33 -975,250 ; -916.67,91.67 -916.67,250 ; -866.67,-8.33 -866.67,250 ; -808.33,91.67 -808.33,250 ; -758.33,-8.33 -758.33,250 ; -700,91.67 -700,250 ; -650,-8.33 -650,250 ; -591.67,91.67 -591.67,250 ; -541.67,-8.33 -541.67,250 ; -483.33,91.67 -483.33,250 ; -433.33,-8.33 -433.33,250 ; -375,91.67 -375,250 ; -325,-8.33 -325,250 ; -266.67,91.67 -266.67,250 ; -216.67,-8.33 -216.67,250 ; -158.33,91.67 -158.33,250 ; -108.33,-8.33 -108.33,250 ; -50,91.67 -50,250 ; 0,-8.33 0,250 ; 58.33,91.67 58.33,250 ; 108.33,-8.33 108.33,250 ; 166.67,91.67 166.67,250 ; 216.67,-8.33 216.67,250 ; 275,91.67 275,250 ; 325,-8.33 325,250 ; 383.33,91.67 383.33,250 ; 433.33,-8.33 433.33,250 ; 491.67,91.67 491.67,250 ; 541.67,-8.33 541.67,250 ; 600,91.67 600,250 ; 650,-8.33 650,250 ; 708.33,91.67 708.33,250 ; 758.33,-8.33 758.33,250 ; 816.67,91.67 816.67,250 ; 866.67,-8.33 866.67,250 ; 925,91.67 925,250 ; 991.67,-8.33 991.67,250 ; 1025,500 1025,675 ; 1149.91,483.25 ccw(c1200,533.33) 1250.09,483.25 ; 1149.91,616.75 cw(c1200,566.67) 1250.09,616.75 ; 1150,416.67 1150,200 1366.67,200 ; 1175,458.33 1150,483.33 1150,491.67 1150,616.67 1175,641.67 1325,641.67 1350,616.67 1350,483.33 1325,458.33 ; 1200,100 1200,200 ; 1225.02,458.31 1225.02,199.98 1225,175 ccw(c1250,175) 1275,175 1275,200 1275.02,458.31 ; 1249.91,483.25 ccw(c1300,533.33) 1350.09,483.25 ; 1249.91,616.75 cw(c1300,566.67) 1350.09,616.75 ; 1250,483.33 1250,616.67 ; 1300,100 1300,200 ; -1366.67,-116.67 -1366.67,458.33 1366.67,458.33 1366.67,-116.67 -1366.67,-116.67
Mechanical 15:
  lines w3.94: -35,0 0,0 ; 0,-35 0,0 ; 0,35 0,0 ; 35,0 0,0 ; -1380,-130 -1380,715 1380,715 1380,-130 -1380,-130
3D body: height 275.59, standoff 196.85, extent -1275.58,150 -1225,458.33
3D body: height 275.59, standoff 196.85, extent 1224.44,149.98 1275.02,458.31
3D body: height 314.96, standoff 157.48, extent 1149.91,458.33 1350,641.67
3D body: height 314.96, standoff 157.48, extent -1350.09,458.33 -1149.91,641.67
3D body: height 129.92, standoff 0, extent -1366.65,-116.65 1366.65,416.65
3D body: height 492.13, standoff 0, extent -1366.65,200.02 -1150.02,416.65
3D body: height 492.13, standoff 0, extent -1366.65,416.69 1366.65,458.31
3D body: height 354.33, standoff 118.11, extent -1049.98,458.35 1049.98,699.98
3D body: height 492.13, standoff 0, extent 1150.02,200.02 1366.65,416.65
3D body: height 492.13, standoff 0, extent -1100.5,249.55 1100.45,416.67

## DB_50F [mil] "D Type Connector, 50 Pin,FeMale, ST"
height 433.07
pads (52):
  rect 80x80 hole 40: 1(880,110)
  round 80 hole 40: 2(770,110) 3(660,110) 4(550,110) 5(440,110) 6(330,110) 7(220,110) 8(110,110) 9(0,110) 10(-110,110) 11(-220,110) 12(-330,110) 13(-440,110) 14(-550,110) 15(-660,110) 16(-770,110) 17(-880,110) 18(825,0) 19(715,0) 20(605,0) 21(495,0) 22(385,0) 23(275,0) 24(165,0) 25(55,0) 26(-55,0) 27(-165,0) 28(-275,0) 29(-385,0) 30(-495,0) 31(-605,0) 32(-715,0) 33(-825,0) 34(880,-110) 35(770,-110) 36(660,-110) 37(550,-110) 38(440,-110) 39(330,-110) 40(220,-110) 41(110,-110) 42(0,-110) 43(-110,-110) 44(-220,-110) 45(-330,-110) 46(-440,-110) 47(-550,-110) 48(-660,-110) 49(-770,-110) 50(-880,-110)
  round 180 hole 120: BO1(-1130,0) BO2(1130,0)
Top Overlay:
  lines w10: -995.23,115 cw(c-940,115) -944.81,170.02 ; -995,115 -935,-145 ; -945,170 945,170 ; -934.85,-145.3 ccw(c-895,-125) -895,-169.72 ; -895,-170 895,-170 ; 895,-169.72 ccw(c895,-125) 934.85,-145.3 ; 935,-145 995,115 ; 944.81,170.02 cw(c940,115) 995.23,115 ; -1290,-140 ccw(c-1230,-140) -1230,-200 1230,-200 ccw(c1230,-140) 1290,-140 1290,140 ccw(c1230,140) 1230,200 -1230,200 ccw(c-1230,140) -1290,140 -1290,-140
Mechanical 13:
  lines w3.94: -995.23,115 cw(c-940,115) -944.81,170.02 ; -995,115 -935,-145 ; -945,170 945,170 ; -934.85,-145.3 ccw(c-895,-125) -895,-169.72 ; -895,-170 895,-170 ; 895,-169.72 ccw(c895,-125) 934.85,-145.3 ; 935,-145 995,115 ; 944.81,170.02 cw(c940,115) 995.23,115 ; -1290,-140 ccw(c-1230,-140) -1230,-200 1230,-200 ccw(c1230,-140) 1290,-140 1290,140 ccw(c1230,140) 1230,200 -1230,200 ccw(c-1230,140) -1290,140 -1290,-140
Mechanical 15:
  lines w3.94: -30,0 0,0 ; 0,-30 0,0 ; 0,30 0,0 ; 30,0 0,0 ; -1305,-215 1305,-215 1305,216 -1305,216 -1305,-215
3D body: height 208, standoff 200, extent -1289.98,-199.98 1289.98,199.98
3D body: height 433.07, standoff 0, extent -995.23,-170 995,170

## DHT22-H [mil]
pads (4):
  oct 60x80 hole 40: 1(-150,0) 2(-50,0) 3(50,0) 4(150,0)
via 0,1058 diameter 118.11 hole 118.11
Top Overlay:
  circle w10: c-240,70 r10
  rectangle: 140,-10 160,10
  rectangle: -160,-10 -140,10
  rectangle: -60,-10 -40,10
  rectangle: 40,-10 60,10
  lines w6: -100,-25 -75,-50 -25,-50 0,-25 ; -100,-25 -125,-50 -175,-50 -200,-25 -200,25 -175,50 -125,50 -100,25 ; -100,-25 -100,25 ; -100,25 -75,50 -25,50 0,25 ; 0,-25 0,25 ; 0,-25 25,-50 75,-50 100,-25 ; 0,25 25,50 75,50 100,25 ; 100,-25 125,-50 175,-50 200,-25 200,25 175,50 125,50 100,25 ; 100,-25 100,25
  lines w10: -200,0 -300,0 -300,1175 300,1175 300,0 200,0
3D body "DHT22-H.step": height 315.35, standoff -49.21, extent -297.24,-5 297.24,1180.05

## DHT22-V [mil]
pads (4):
  oct 60x80 hole 40: 1(-150,0) 2(-50,0) 3(50,0) 4(150,0)
Top Overlay:
  circle w10: c-240,0 r14.14
  rectangle: 140,-10 160,10
  rectangle: -160,-10 -140,10
  rectangle: -60,-10 -40,10
  rectangle: 40,-10 60,10
  lines w10: -300,-90 -300,230 300,230 300,-90 -300,-90
3D body "DHT22-V.step": height 988.19, standoff -334.65, extent -297.24,-85.35 297.24,230

## DIODE0.2 [mil]
pads (2):
  round 60 hole 31.5: 1(-100,0) 2(100,0)
Top Overlay:
  lines w6: -70,0 -50,0 ; -25,-35 -25,35 ; 50,0 70,0 ; -50,-35 -50,35 50,35 50,-35 -50,-35